# Altium footprint library Burn Wire Dev Board.PcbLib: 40 footprints (part 2 of 3)
Each footprint in its own frame and in the unit in brackets; x right, y up, seen from the top. Pads: shape width x height; smd on the part's side, far side on the other; paste and mask are expansions set on the pad; w line width, h text height; cw(c..) or ccw(c..) is an arc to the next point about the centre after c.
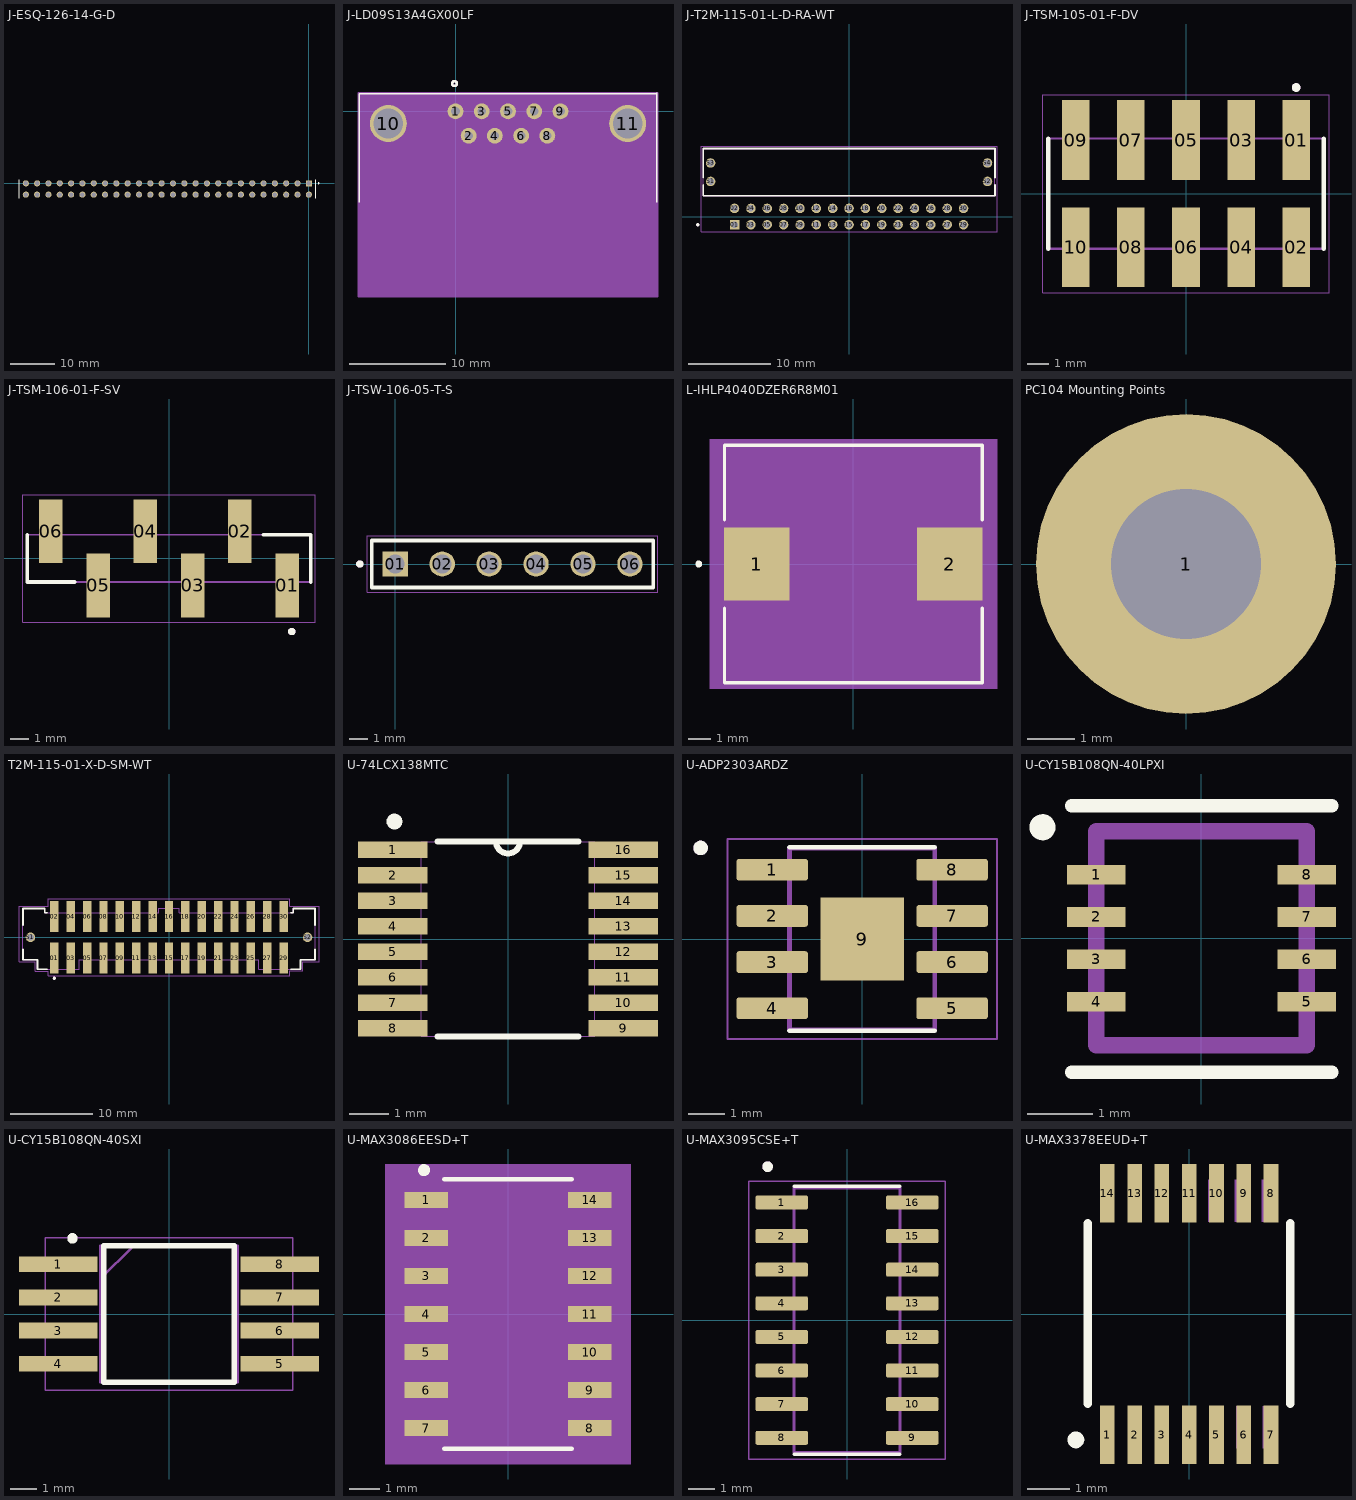
[diagram p1: the footprints below, top view; thin cyan lines are the x and y axes]

## J-ESQ-126-14-G-D [mm]
pads (52):
  rect 1.37x1.37 hole 1.02: 01(0,0)
  round 1.37 hole 1.02: 02(0,-2.54) 03(-2.54,0) 04(-2.54,-2.54) 05(-5.08,0) 06(-5.08,-2.54) 07(-7.62,0) 08(-7.62,-2.54) 09(-10.16,0) 10(-10.16,-2.54) 11(-12.7,0) 12(-12.7,-2.54) 13(-15.24,0) 14(-15.24,-2.54) 15(-17.78,0) 16(-17.78,-2.54) 17(-20.32,0) 18(-20.32,-2.54) 19(-22.86,0) 20(-22.86,-2.54) 21(-25.4,0) 22(-25.4,-2.54) 23(-27.94,0) 24(-27.94,-2.54) 25(-30.48,0) 26(-30.48,-2.54) 27(-33.02,0) 28(-33.02,-2.54) 29(-35.56,0) 30(-35.56,-2.54) 31(-38.1,0) 32(-38.1,-2.54) 33(-40.64,0) 34(-40.64,-2.54) 35(-43.18,0) 36(-43.18,-2.54) 37(-45.72,0) 38(-45.72,-2.54) 39(-48.26,0) 40(-48.26,-2.54) 41(-50.8,0) 42(-50.8,-2.54) 43(-53.34,0) 44(-53.34,-2.54) 45(-55.88,0) 46(-55.88,-2.54) 47(-58.42,0) 48(-58.42,-2.54) 49(-60.96,0) 50(-60.96,-2.54) 51(-63.5,0) 52(-63.5,-2.54)
Top Overlay:
  circle w0.2: c2.175,0 r0.1
  lines w0.2: -65.025,-3.391 -65.025,0.851 ; 1.525,-3.391 1.525,0.851
3D body "ESQ-126-14-G-D.stp": height 11.1, standoff -12.14, extent -65.024,-3.81 1.524,1.27

## J-LD09S13A4GX00LF [mil]
pads (11):
  round 65 hole 35.43 mask+0: 1(0,0) 2(53.94,-100) 3(107.87,0) 4(161.81,-100) 5(215.75,0) 6(269.69,-100) 7(323.62,0) 8(377.56,-100) 9(431.5,0)
  round 152 hole 122.05: 10(-276.18,-50) 11(707.68,-50)
Top Overlay:
  circle w10: c-3.94,114.17 r10
  lines w6: -395.75,-374 -395.75,72.32 827.24,72.32 ; 827.24,-374 827.24,77.17
Bottom Overlay:
  circle w10: c-3.94,114.17 r10
Mechanical 13:
  circle w10: c-3.94,114.17 r10
  lines w1: -390.75,-752.37 -390.75,67.32 822.24,67.32 822.24,-752.37 -390.75,-752.37
Mechanical 15:
  region: 832.24,77.32 -400.75,77.32 -400.75,-762.37 832.24,-762.37
  lines w6: -400.75,-762.37 832.24,-762.37 832.24,77.32 -400.75,77.32 -400.75,-762.37
3D body "sld09s13a4gx00lf.stp": height 531.09, standoff -122.45, extent -391.53,-748.47 825,68.46
3D body: height 10, standoff 0, extent 0,0 10,10

## J-T2M-115-01-L-D-RA-WT [mm]
pads (34):
  rect 1.163x1.163 hole 0.813: 01(-14,-1)
  round 1.163 hole 0.813: 02(-14,1) 03(-12,-1) 04(-12,1) 05(-10,-1) 06(-10,1) 07(-8,-1) 08(-8,1) 09(-6,-1) 10(-6,1) 11(-4,-1) 12(-4,1) 13(-2,-1) 14(-2,1) 15(0,-1) 16(0,1) 17(2,-1) 18(2,1) 19(4,-1) 20(4,1) 21(6,-1) 22(6,1) 23(8,-1) 24(8,1) 25(10,-1) 26(10,1) 27(12,-1) 28(12,1) 29(14,-1) 30(14,1) S1(-16.925,4.29) S2(16.925,4.29) S3(-16.925,6.55) S4(16.925,6.55)
Top Overlay:
  circle w0.2: c-18.487,-1 r0.1
  lines w0.2: -17.837,3.853 -17.837,2.53 17.837,2.53 17.837,3.853 ; -17.837,4.727 -17.837,8.32 17.837,8.32 17.837,4.727
Mechanical 13:
  circle w0.2: c-18.487,-1 r0.1
  lines w0.1: -17.837,2.53 -17.837,8.32 ; -17.837,2.53 17.837,2.53 ; -17.837,2.53 -17.837,8.32 ; -17.837,8.32 17.837,8.32 ; -17.837,8.32 17.837,8.32 ; 17.837,2.53 17.837,8.32 ; 17.837,2.53 17.837,8.32
Mechanical 15:
  lines w0.05: -18.087,-1.832 -18.087,8.57 18.087,8.57 18.087,-1.832 -18.087,-1.832
3D body "T2M-115-01-L-D-RA-WT.stp": height 7.5, standoff -2.23, extent -17.78,-1.224 17.894,8.336

## J-TSM-105-01-F-DV [mm]
pads (10):
  rect 1.27x3.68 smd: 01(5.08,2.475) 02(5.08,-2.475) 03(2.54,2.475) 04(2.54,-2.475) 05(0,2.475) 06(0,-2.475) 07(-2.54,2.475) 08(-2.54,-2.475) 09(-5.08,2.475) 10(-5.08,-2.475)
Top Overlay:
  circle w0.2: c5.08,4.9 r0.1
  lines w0.2: -6.35,-2.54 -6.35,2.54 ; 6.35,-2.54 6.35,2.54
Mechanical 13:
  circle w0.2: c5.08,4.9 r0.1
  lines w0.1: -6.35,-2.54 -6.35,2.54 6.35,2.54 6.35,-2.54 -6.35,-2.54
Mechanical 15:
  lines w0.05: -6.6,-4.565 -6.6,4.565 6.6,4.565 6.6,-4.565 -6.6,-4.565
3D body "step_temp.STEP": height 9.91, standoff 0, extent -6.35,-3.848 6.35,3.848

## J-TSM-106-01-F-SV [mm]
pads (6):
  rect 1.27x3.43 smd: 01(6.35,-1.46) 02(3.81,1.46) 03(1.27,-1.46) 04(-1.27,1.46) 05(-3.81,-1.46) 06(-6.35,1.46)
Top Overlay:
  circle w0.2: c6.6,-3.935 r0.1
  lines w0.2: -7.62,1.27 -7.62,-1.27 -5.08,-1.27 ; 5.08,1.27 7.62,1.27 7.62,-1.27
Mechanical 13:
  circle w0.2: c6.6,-3.935 r0.1
  lines w0.1: -7.62,-1.27 7.62,-1.27 7.62,1.27 -7.62,1.27 -7.62,-1.27
Mechanical 15:
  lines w0.05: -7.87,-3.425 7.87,-3.425 7.87,3.425 -7.87,3.425 -7.87,-3.425
3D body "TSM-106-01-F-SV.stp": height 9.68, standoff 0.03, extent -7.62,-2.997 7.62,2.286

## J-TSW-106-05-T-S [mm]
pads (6):
  rect 1.37x1.37 hole 1.02: 01(0,0)
  round 1.37 hole 1.02: 02(2.54,0) 03(5.08,0) 04(7.62,0) 05(10.16,0) 06(12.7,0)
Top Overlay:
  circle w0.2: c-1.92,0 r0.1
  lines w0.2: -1.27,-1.27 13.97,-1.27 13.97,1.27 -1.27,1.27 -1.27,-1.27
Mechanical 13:
  circle w0.2: c-1.92,0 r0.1
  lines w0.1: -1.27,-1.27 13.97,-1.27 13.97,1.27 -1.27,1.27 -1.27,-1.27
Mechanical 15:
  lines w0.05: -1.52,-1.52 14.22,-1.52 14.22,1.52 -1.52,1.52 -1.52,-1.52
3D body "TSW-106-05-T-S.stp": height 5.21, standoff -3.3, extent -1.346,-1.27 14.021,1.27

## L-IHLP4040DZER6R8M01 [mil]
pads (2):
  rect 115x128 smd paste+0 mask+0: 1(-168.5,0) 2(168.5,0)
Top Overlay:
  circle w6: c-270,0 r3
  lines w6: -225,-77.1 -225,-207.5 225,-207.5 225,-77.1 ; -225,77.1 -225,207.5 225,207.5 225,77.1
Mechanical 5:
  region: 251,-217.5 -251,-217.5 -251,217.5 251,217.5
Mechanical 13:
  circle w0: c-200,0 r3
  lines w1: -220,-202.5 220,-202.5 220,202.5 -220,202.5 -220,-202.5
Mechanical 15:
  region: -230,-74 -236,-74 -236,74 -230,74 -230,212.5 230,212.5 230,74 236,74 236,-74 230,-74 230,-212.5 -230,-212.5
  lines w6: -236,-74 -236,74 -230,74 -230,212.5 230,212.5 230,74 236,74 236,-74 230,-74 230,-212.5 -230,-212.5 -230,-74 -236,-74
3D body "IND_IHLP-4040DZ_VIS.step": height 160, standoff 0, extent -220,-202.48 220,202.48

## PC104 Mounting Points [mm]
pads (1):
  round 6.35 hole 3.18: 1(0,0)

## T2M-115-01-X-D-SM-WT [mm]
pads (32):
  rect 1.02x3.8 smd: 01(-14,-2.535) 02(-14,2.535) 03(-12,-2.535) 04(-12,2.535) 05(-10,-2.535) 06(-10,2.535) 07(-8,-2.535) 08(-8,2.535) 09(-6,-2.535) 10(-6,2.535) 11(-4,-2.535) 12(-4,2.535) 13(-2,-2.535) 14(-2,2.535) 15(0,-2.535) 16(0,2.535) 17(2,-2.535) 18(2,2.535) 19(4,-2.535) 20(4,2.535) 21(6,-2.535) 22(6,2.535) 23(8,-2.535) 24(8,2.535) 25(10,-2.535) 26(10,2.535) 27(12,-2.535) 28(12,2.535) 29(14,-2.535) 30(14,2.535)
  round 1.163 hole 0.813: S1(-16.925,0) S2(16.925,0)
Top Overlay:
  circle w0.2: c-14,-5 r0.1
  lines w0.2: -17.835,-1.495 -17.835,-2.74 -16.065,-2.74 -16.065,-3.92 -14.86,-3.92 ; -17.835,1.495 -17.835,3.52 -15.175,3.52 -15.175,3.01 -14.86,3.01 ; 14.86,-3.92 16.065,-3.92 16.065,-2.74 17.835,-2.74 17.835,-1.495 ; 14.86,3.01 15.175,3.01 15.175,3.52 17.835,3.52 17.835,1.495
Top Paste:
  circle w1.145: c-16.925,0 r0.573
  circle w1.145: c16.925,0 r0.573
Mechanical 13:
  circle w0.2: c-14,-5 r0.1
  lines w0.1: -17.835,-2.74 -17.835,3.52 -15.175,3.52 -15.175,3.01 -1.27,3.01 -1.27,3.52 1.27,3.52 1.27,3.01 15.175,3.01 15.175,3.52 17.835,3.52 17.835,-2.74 16.065,-2.74 16.065,-3.92 10.985,-3.92 10.985,-2.74 -10.985,-2.74 -10.985,-3.92 -16.065,-3.92 -16.065,-2.74 -17.835,-2.74
Mechanical 15:
  lines w0.05: -18.32,-2.99 -16.315,-2.99 -16.315,-4.17 -14.76,-4.17 -14.76,-4.685 14.76,-4.685 14.76,-4.1 16.315,-4.1 16.315,-2.99 18.32,-2.99 18.32,3.77 14.76,3.77 14.76,4.685 -14.76,4.685 -14.76,3.77 -18.32,3.77 -18.32,-2.99
3D body "T2M-115-01-L-D-SM-WT.stp": height 6.6, standoff -1.6, extent -17.8,-4.3 17.874,4.327

## U-74LCX138MTC [mm]
pads (16):
  rect 1.78x0.42 smd mask+0.076: 1(-2.94,2.275) 2(-2.94,1.625) 3(-2.94,0.975) 4(-2.94,0.325) 5(-2.94,-0.325) 6(-2.94,-0.975) 7(-2.94,-1.625) 8(-2.94,-2.275) 9(2.94,-2.275) 10(2.94,-1.625) 11(2.94,-0.975) 12(2.94,-0.325) 13(2.94,0.325) 14(2.94,0.975) 15(2.94,1.625) 16(2.94,2.275)
Top Overlay:
  circle w0.2: c-2.9,3 r0.1
  lines w0.152: -1.803,-2.489 1.803,-2.489 ; -1.803,2.489 -0.305,2.489 ; 1.803,2.489 0.305,2.489 ; -0.305,2.489 ccw(c0,2.489) 0.305,2.489 ; -0.305,2.489 0.305,2.489
Mechanical 13:
  lines w0: -0.305,2.489 ccw(c0,2.489) 0.305,2.489 ; -0.305,2.489 -2.21,2.489 -2.21,-2.489 2.21,-2.489 2.21,2.489 0.305,2.489 ; -0.305,2.489 0.305,2.489 ; -3.2,-2.413 -2.21,-2.413 -2.21,-2.134 -3.2,-2.134 -3.2,-2.413 ; -3.2,-1.778 -2.21,-1.778 -2.21,-1.473 -3.2,-1.473 -3.2,-1.778 ; -3.2,-1.118 -2.21,-1.118 -2.21,-0.813 -3.2,-0.813 -3.2,-1.118 ; -3.2,-0.483 -2.21,-0.483 -2.21,-0.178 -3.2,-0.178 -3.2,-0.483 ; -3.2,0.178 -2.21,0.178 -2.21,0.483 -3.2,0.483 -3.2,0.178 ; -3.2,0.813 -2.21,0.813 -2.21,1.118 -3.2,1.118 -3.2,0.813 ; -3.2,1.473 -2.21,1.473 -2.21,1.778 -3.2,1.778 -3.2,1.473 ; -3.2,2.134 -2.21,2.134 -2.21,2.413 -3.2,2.413 -3.2,2.134 ; 2.21,-2.413 3.2,-2.413 3.2,-2.134 2.21,-2.134 2.21,-2.413 ; 2.21,-1.778 3.2,-1.778 3.2,-1.473 2.21,-1.473 2.21,-1.778 ; 2.21,-1.118 3.2,-1.118 3.2,-0.813 2.21,-0.813 2.21,-1.118 ; 2.21,-0.483 3.2,-0.483 3.2,-0.178 2.21,-0.178 2.21,-0.483 ; 2.21,0.178 3.2,0.178 3.2,0.483 2.21,0.483 2.21,0.178 ; 2.21,0.813 3.2,0.813 3.2,1.118 2.21,1.118 2.21,0.813 ; 2.21,1.473 3.2,1.473 3.2,1.778 2.21,1.778 2.21,1.473 ; 2.21,2.134 3.2,2.134 3.2,2.413 2.21,2.413 2.21,2.134
3D body "TSSOP16_5X4P5_ONS.step": height 0.89, standoff 0, extent -3.2,-2.502 3.2,2.502

## U-ADP2303ARDZ [mm]
pads (9):
  rrect25% 1.97x0.6 smd: 1(-2.475,1.905) 2(-2.475,0.635) 3(-2.475,-0.635) 4(-2.475,-1.905) 5(2.475,-1.905) 6(2.475,-0.635) 7(2.475,0.635) 8(2.475,1.905)
  rect 2.29x2.29 smd paste-2: 9(0,0)
Top Overlay:
  circle w0.2: c-4.445,2.505 r0.1
  lines w0.127: -2,-2.525 2,-2.525 ; -2,2.525 2,2.525
Top Paste:
  region: -0.11,0.11 -0.92,0.11 -0.92,0.92 -0.11,0.92
  region: 0.92,0.11 0.11,0.11 0.11,0.92 0.92,0.92
  region: 0.92,-0.92 0.11,-0.92 0.11,-0.11 0.92,-0.11
  region: -0.11,-0.92 -0.92,-0.92 -0.92,-0.11 -0.11,-0.11
Mechanical 13:
  circle w0.2: c-4.445,2.505 r0.1
  lines w0.127: -2,-2.5 2,-2.5 2,2.5 -2,2.5 -2,-2.5
Mechanical 15:
  lines w0.05: -3.71,-2.75 3.71,-2.75 3.71,2.75 -3.71,2.75 -3.71,-2.75
3D body "step_temp.STEP": height 1.75, standoff 0, extent -3,-2.45 3,2.45

## U-CY15B108QN-40LPXI [mm]
pads (8):
  rect 0.9x0.3 smd: 1(-1.615,0.975) 2(-1.615,0.325) 3(-1.615,-0.325) 4(-1.615,-0.975) 5(1.615,-0.975) 6(1.615,-0.325) 7(1.615,0.325) 8(1.615,0.975)
Top Overlay:
  circle w0.2: c-2.438,1.702 r0.1
  lines w0.2: -1.993,-2.057 2.007,-2.057 ; -1.993,2.032 2.007,2.032
Mechanical 1:
  lines w0.254: -1.615,-1.64 1.615,-1.64 1.615,1.64 -1.615,1.64 -1.615,-1.64
3D body: height 0.55, standoff 0, extent -1.615,-1.64 1.615,1.64

## U-CY15B108QN-40SXI [mm]
pads (8):
  rect 3x0.6 smd: 1(-4.25,1.905) 2(-4.25,0.635) 3(-4.25,-0.635) 4(-4.25,-1.905) 5(4.25,-1.905) 6(4.25,-0.635) 7(4.25,0.635) 8(4.25,1.905)
Top Overlay:
  circle w0.2: c-3.7,2.9 r0.1
  lines w0.2: -2.5,-2.615 2.5,-2.615 2.5,2.615 -2.5,2.615 -2.5,-2.615
Mechanical 13:
  lines w0.1: -2.64,1.345 -1.37,2.615 ; -2.64,-2.615 2.64,-2.615 2.64,2.615 -2.64,2.615 -2.64,-2.615
Mechanical 15:
  lines w0.05: -4.75,-2.915 4.75,-2.915 4.75,2.915 -4.75,2.915 -4.75,-2.915
3D body "CY15B108QN-40SXI.stp": height 2.03, standoff 0, extent -4.002,-2.615 4.002,2.615

## U-MAX3086EESD+T [mil]
pads (14):
  rect 57.5x21 smd paste+0 mask+0: 1(-107.25,150) 2(-107.25,100) 3(-107.25,50) 4(-107.25,0) 5(-107.25,-50) 6(-107.25,-100) 7(-107.25,-150) 8(107.25,-150) 9(107.25,-100) 10(107.25,-50) 11(107.25,0) 12(107.25,50) 13(107.25,100) 14(107.25,150)
Top Overlay:
  circle w7.87: c-110.24,188.98 r3.94
  lines w6: -83.5,-177 83.5,-177 ; -83.5,177 83.5,177
Mechanical 5:
  region: 161,-197 -161,-197 -161,197 161,197
Mechanical 13:
  lines w0: -12,172 ccw(c0,172) 12,172
  lines w1: -122,-159.5 -78.5,-159.5 -78.5,-140.5 -122,-140.5 -122,-159.5 ; -122,-109.5 -78.5,-109.5 -78.5,-90.5 -122,-90.5 -122,-109.5 ; -122,-59.5 -78.5,-59.5 -78.5,-40.5 -122,-40.5 -122,-59.5 ; -122,-9.5 -78.5,-9.5 -78.5,9.5 -122,9.5 -122,-9.5 ; -122,40.5 -78.5,40.5 -78.5,59.5 -122,59.5 -122,40.5 ; -122,90.5 -78.5,90.5 -78.5,109.5 -122,109.5 -122,90.5 ; -122,140.5 -78.5,140.5 -78.5,159.5 -122,159.5 -122,140.5 ; -78.5,-172 -78.5,172 78.5,172 78.5,-172 -78.5,-172 ; 78.5,-159.5 122,-159.5 122,-140.5 78.5,-140.5 78.5,-159.5 ; 78.5,-109.5 122,-109.5 122,-90.5 78.5,-90.5 78.5,-109.5 ; 78.5,-59.5 122,-59.5 122,-40.5 78.5,-40.5 78.5,-59.5 ; 78.5,-9.5 122,-9.5 122,9.5 78.5,9.5 78.5,-9.5 ; 78.5,40.5 122,40.5 122,59.5 78.5,59.5 78.5,40.5 ; 78.5,90.5 122,90.5 122,109.5 78.5,109.5 78.5,90.5 ; 78.5,140.5 122,140.5 122,159.5 78.5,159.5 78.5,140.5
  text "*" at -76,119 h50
3D body "21-0041B_14_MXM.step": height 69.09, standoff 0, extent -122.01,-172.01 122.01,172
3D body: height 10, standoff 0, extent 0,0 10,10

## U-MAX3095CSE+T [mm]
pads (16):
  rrect25% 1.98x0.53 smd: 1(-2.465,4.445) 2(-2.465,3.175) 3(-2.465,1.905) 4(-2.465,0.635) 5(-2.465,-0.635) 6(-2.465,-1.905) 7(-2.465,-3.175) 8(-2.465,-4.445) 9(2.465,-4.445) 10(2.465,-3.175) 11(2.465,-1.905) 12(2.465,-0.635) 13(2.465,0.635) 14(2.465,1.905) 15(2.465,3.175) 16(2.465,4.445)
Top Overlay:
  circle w0.2: c-3,5.8 r0.1
  lines w0.127: -2,-5.06 2,-5.06 ; -2,5.06 2,5.06
Mechanical 13:
  circle w0.2: c-3,5.8 r0.1
  lines w0.127: -2,-5 2,-5 2,5 -2,5 -2,-5
Mechanical 15:
  lines w0.05: -3.71,-5.25 3.71,-5.25 3.71,5.25 -3.71,5.25 -3.71,-5.25
3D body "MAX3095CSE+T.STEP": height 1.75, standoff 0, extent -3,-4.95 3,4.95

## U-MAX3378EEUD+T [mm]
pads (14):
  rect 0.35x1.4 smd: 1(-1.95,-2.875) 2(-1.3,-2.875) 3(-0.65,-2.875) 4(0,-2.875) 5(0.65,-2.875) 6(1.3,-2.875) 7(1.95,-2.875) 8(1.95,2.875) 9(1.3,2.875) 10(0.65,2.875) 11(0,2.875) 12(-0.65,2.875) 13(-1.3,2.875) 14(-1.95,2.875)
Top Overlay:
  circle w0.2: c-2.7,-3 r0.1
  lines w0.2: -2.413,-2.141 -2.413,2.159 ; 2.413,-2.141 2.413,2.159
Mechanical 13:
  region: 0.705,2.2 0.455,2.2 0.455,3.2 0.705,3.2
  region: 1.975,2.2 1.725,2.2 1.725,3.2 1.975,3.2
  region: 1.34,2.2 1.09,2.2 1.09,3.2 1.34,3.2
  region: 2.005,-3.2 1.755,-3.2 1.755,-2.2 2.005,-2.2
  region: 1.37,-3.2 1.12,-3.2 1.12,-2.2 1.37,-2.2
  region: 0.735,-3.2 0.485,-3.2 0.485,-2.2 0.735,-2.2
  region: -1.835,2.2 -2.085,2.2 -2.085,3.2 -1.835,3.2
  region: -1.185,2.2 -1.435,2.2 -1.435,3.2 -1.185,3.2
  region: -0.535,2.2 -0.785,2.2 -0.785,3.2 -0.535,3.2
  region: 0.115,2.2 -0.135,2.2 -0.135,3.2 0.115,3.2
  region: 0.115,-3.2 -0.135,-3.2 -0.135,-2.2 0.115,-2.2
  region: -0.535,-3.2 -0.785,-3.2 -0.785,-2.2 -0.535,-2.2
  region: -1.185,-3.2 -1.435,-3.2 -1.435,-2.2 -1.185,-2.2
  region: -1.835,-3.2 -2.085,-3.2 -2.085,-2.2 -1.835,-2.2
3D body "step_temp.STEP": height 1.1, standoff 0, extent -2.5,-3.175 2.5,3.225